# Altium footprint library Ground_Support_PcbLib.PcbLib: 21 footprints (part 2 of 2)
Each footprint in its own frame and in the unit in brackets; x right, y up, seen from the top. Pads: shape width x height; smd on the part's side, far side on the other; paste and mask are expansions set on the pad; w line width, h text height; cw(c..) or ccw(c..) is an arc to the next point about the centre after c.
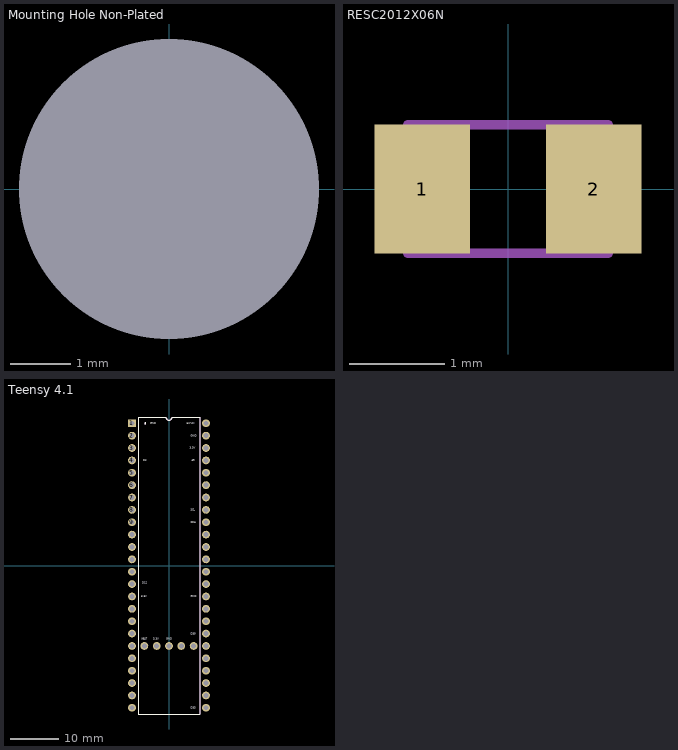
[diagram p1: the footprints below, top view; thin cyan lines are the x and y axes]

## Mounting Hole Non-Plated [mm]
pads (1):
  round 0 hole 5 unplated: "Mounting Hole Non-Plated"(0,0)

## RESC2012X06N [mm] "Chip Resistor, 2-Leads, Body 2.00x1.25mm, IPC Medium Density"
height 0.6
pads (2):
  rect 1x1.35 smd: 1(-0.9,0) 2(0.9,0)
Top Assembly:
  lines w0.1: -1.05,-0.675 -1.05,0.675 1.05,0.675 1.05,-0.675 -1.05,-0.675
  text ".Designator" at -3.499,-0.233 h0.7
3D body "RESC2012X06N.step": height 0.6, standoff 0, extent -1.05,-0.675 1.05,0.675

## SPST Switch [mm]

## Teensy 4.1 [mm]
pads (53):
  rect 1.6x1.6 hole 1: 1(-7.6,29.21)
  round 1.6 hole 1: 2(-7.6,26.67) 3(-7.6,24.13) 4(-7.6,21.59) 5(-7.6,19.05) 6(-7.6,16.51) 7(-7.6,13.97) 8(-7.6,11.43) 9(-7.6,8.89) 10(-7.6,6.35) 11(-7.6,3.81) 12(-7.6,1.27) 13(-7.6,-1.27) 14(-7.6,-3.81) 15(-7.6,-6.35) 16(-7.6,-8.89) 17(-7.6,-11.43) 18(-7.6,-13.97) 19(-7.6,-16.51) 20(-7.6,-19.05) 21(-7.6,-21.59) 22(-7.6,-24.13) 23(-7.6,-26.67) 24(-7.6,-29.21) 25(7.6,-29.21) 26(7.6,-26.67) 27(7.6,-24.13) 28(7.6,-21.59) 29(7.6,-19.05) 30(7.6,-16.51) 31(7.6,-13.97) 32(7.6,-11.43) 33(7.6,-8.89) 34(7.6,-6.35) 35(7.6,-3.81) 36(7.6,-1.27) 37(7.6,1.27) 38(7.6,3.81) 39(7.6,6.35) 40(7.6,8.89) 41(7.6,11.43) 42(7.6,13.97) 43(7.6,16.51) 44(7.6,19.05) 45(7.6,21.59) 46(7.6,24.13) 47(7.6,26.67) 48(7.6,29.21) 49(-5.06,-16.51) 50(-2.53,-16.51) 51(0,-16.51) 52(2.53,-16.51) 53(5.06,-16.51)
Top Overlay:
  circle w0.254: c-4.85,29.21 r0.1
  lines w0.2: -6.3,-30.48 6.3,-30.48 6.3,30.48 0.635,30.48 cw(c0,30.48) -0.635,30.48 -6.3,30.48 -6.3,-30.48
  text "SDA" at 4.467,8.69 h0.4
  text "SCL" at 4.467,11.23 h0.4
  text "D39" at 4.467,-14.17 h0.4
  text "D33" at 4.467,-29.41 h0.4
  text "GND" at 4.467,-6.55 h0.4
  text "GND" at -3.876,29.01 h0.4
  text "3.3V" at 4.3,23.93 h0.4
  text "D2" at -5.333,21.39 h0.4
  text "GND" at -0.533,-15.2 h0.4
  text "VBAT" at -5.733,-15.2 h0.4
  text "5V/VIN" at 3.6,29.025 h0.4
  text "D12" at -5.5,-3.7 h0.4
  text "3.3V" at -3.2,-15.2 h0.4
  text "GND" at 4.467,26.47 h0.4
  text "3.3V" at -5.7,-6.55 h0.4
  text "A9" at 4.667,21.39 h0.4
Top Assembly:
  circle w0.254: c-4.85,29.21 r0.1
  lines w0.2: -6.3,-30.48 6.3,-30.48 6.3,30.48 0.635,30.48 cw(c0,30.48) -0.635,30.48 -6.3,30.48 -6.3,-30.48
  text ".Designator" at -3.499,-0.233 h0.7
3D body "Teensy_4.1.step": height 2.45, standoff -10.11, extent -9.09,-30.61 8.69,31.05

## THERMOCOUPLE [mm]